# Altium footprint library MyComponents_v2.5.PcbLib: 403 footprints (part 19 of 26)
Each footprint in its own frame and in the unit in brackets; x right, y up, seen from the top. Pads: shape width x height; smd on the part's side, far side on the other; paste and mask are expansions set on the pad; w line width, h text height; cw(c..) or ccw(c..) is an arc to the next point about the centre after c.
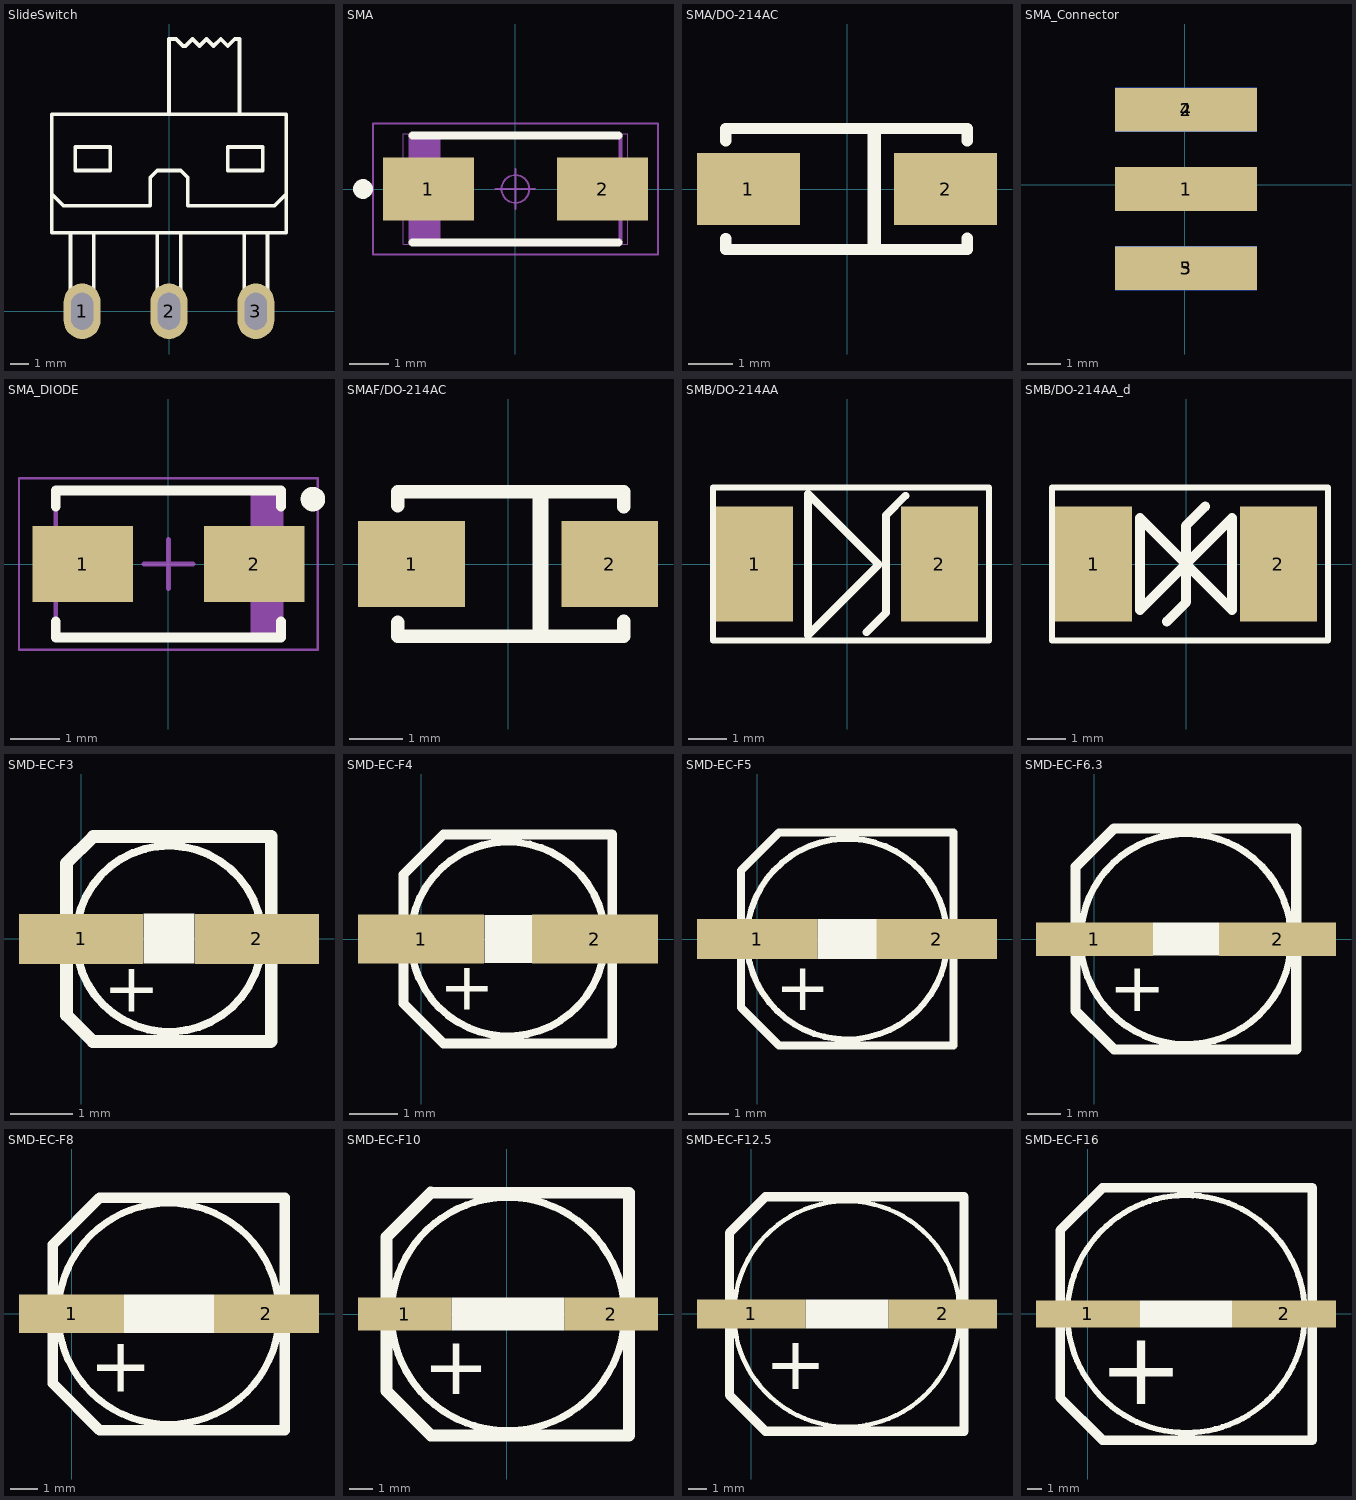
[diagram p18: the footprints below, top view; thin cyan lines are the x and y axes]

## SlideSwitch [mm]
pads (3):
  oval 2x3 hole 1.2 slot 2 at 90 deg: 1(-4.7,0) 2(0,0) 3(4.7,0)
Top Overlay:
  lines w0.2: -6.35,6.35 -5.715,5.715 -1.016,5.715 -1.016,7.239 -0.635,7.62 ; -5.334,4.242 -5.334,-0.127 ccw(c-4.699,0.508) -4.064,-0.127 -4.064,4.242 ; -0.635,4.242 -0.635,-0.127 ccw(c0,0.508) 0.635,-0.127 0.635,4.242 ; -0.127,10.668 3.81,10.668 3.81,14.732 3.556,14.732 3.175,14.351 2.794,14.732 2.413,14.351 2.032,14.732 1.651,14.351 1.27,14.732 0.889,14.351 0.762,14.351 0.381,14.732 0,14.732 0,10.668 ; 4.064,4.242 4.064,-0.127 ccw(c4.699,0.508) 5.334,-0.127 5.334,4.242 ; 6.35,6.35 5.715,5.715 1.016,5.715 1.016,7.239 0.635,7.62 ; -0.635,7.62 0.635,7.62 ; -0.635,7.62 0.635,7.62 ; -6.35,4.242 -6.35,10.668 6.35,10.668 6.35,4.242 -6.35,4.242 ; -5.08,7.62 -5.08,8.89 -3.175,8.89 -3.175,7.62 -5.08,7.62 ; 3.175,7.62 5.08,7.62 5.08,8.89 3.175,8.89 3.175,7.62
3D body "Slide Switch.step": height 6.6, standoff -3.17, extent -6.833,-0.62 6.578,15.621

## SMA [mm]
pads (2):
  rect 2.3x1.6 smd: 1(-2.2,0) 2(2.2,0)
Top Overlay:
  circle w0.25: c-3.85,0 r0.125
  lines w0.2: -2.6,-1.35 2.6,-1.35 ; -2.6,1.35 2.6,1.35
Mechanical 15:
  lines w0.1: -2.548,-1.335 -2.548,1.335 ; -2.448,-1.335 -2.448,1.335 ; -2.348,-1.335 -2.348,1.335 ; -2.248,-1.335 -2.248,1.335 ; -2.148,-1.335 -2.148,1.335 ; -2.047,-1.335 -2.047,1.335 ; -1.948,-1.335 -1.948,1.335 ; -2.648,-1.335 -2.648,1.335 2.648,1.335 2.648,-1.335 -2.648,-1.335
Mechanical 16:
  circle w0.05: c0,0 r0.35
  lines w0.001: -2.83,-1.4 -2.83,1.4 2.83,1.4 2.83,-1.4 -2.83,-1.4
  lines w0.05: -0.5,0 0.5,0 ; 0,-0.5 0,0.5 ; -3.6,-1.65 -3.6,1.65 3.6,1.65 3.6,-1.65 -3.6,-1.65

## SMA/DO-214AC [mm] "SS14/M7"
height 2.7
pads (2):
  rect 2.3x1.6 smd: 1(-2.2,0) 2(2.2,0)
Top Overlay:
  lines w0.254: -2.711,-1.105 -2.711,-1.35 2.689,-1.35 2.689,-1.1 ; -2.711,1.08 -2.711,1.35 2.684,1.35 ; 2.689,1.075 2.689,1.35
  lines w0.3: 0.609,-1.3 0.609,1.3
3D body "User Library-S1G.STEP": height 2.12, standoff -0.02, extent -2.509,-1.342 2.596,1.325

## SMA_Connector [mm]
pads (5):
  rect 4.2x1.3 smd: 1(0.037,-0.125) 2(0.037,2.225) 3(0.037,-2.475)
  rect 4.2x1.3 smd far side: 4(0.037,2.225) 5(0.037,-2.475)

## SMA_DIODE [mm] "Molded Diode, 2-Leads, Body 4.30x2.60mm, IPC Medium Density"
height 2.2
pads (2):
  rect 2.05x1.55 smd: 1(-1.75,0) 2(1.75,0)
Top Overlay:
  circle w0.25: c2.95,1.325 r0.125
  lines w0.2: -2.3,-1.175 -2.3,-1.5 2.3,-1.5 2.3,-1.175 ; -2.3,1.175 -2.3,1.5 2.3,1.5 2.3,1.175
Mechanical 13:
  rectangle: 1.681,-1.46 2.3,1.46
  lines w0.1: -2.3,-1.46 -2.3,1.46 2.3,1.46 2.3,-1.46 -2.3,-1.46
Mechanical 15:
  lines w0.05: -3.05,-1.75 -3.05,1.75 3.05,1.75 3.05,-1.75 -3.05,-1.75
  lines w0.1: -0.5,0 0.5,0 ; 0,-0.5 0,0.5
3D body: height 2.2, standoff 0, extent -2.3,-1.46 2.3,1.46

## SMAF/DO-214AC [mm] "SS14/M7"
height 2.7
pads (2):
  rect 2x1.6 smd: 1(-1.8,0)
  rect 1.8x1.6 smd: 2(1.9,0)
Top Overlay:
  lines w0.254: -2.057,-1.092 -2.057,-1.35 2.159,-1.35 2.159,-1.067 ; -2.057,1.092 -2.057,1.35 2.159,1.35 2.159,1.067
  lines w0.3: 0.609,-1.3 0.609,0 0.609,1.3
3D body "SMAF-DO-214AD.step": height 1, standoff 0, extent -2.307,-1.255 2.393,1.245

## SMB/DO-214AA [mm]
pads (2):
  rect 2x3 smd: 1(-2.413,0) 2(2.413,0)
Top Overlay:
  lines w0.152: 3.7,-2 -3.5,-2 -3.5,2 3.7,2 3.7,-2 ; 3.7,-2 3.7,-2
  lines w0.203: 0.508,-1.778 1.016,-1.27 1.016,1.27 1.524,1.778 ; -1.016,-1.854 -1.016,1.829 0.826,-0.013 -1.016,-1.854
3D body "SMBJ33CAHE3.step": height 2.44, standoff -0.01, extent -2.684,-2.135 2.906,1.805

## SMB/DO-214AA_d [mm] "双向"
pads (2):
  rect 2x3 smd: 1(-2.413,0) 2(2.413,0)
Top Overlay:
  lines w0.152: 3.7,-2 3.7,2 -3.5,2 -3.5,-2 3.7,-2 ; 3.7,-2 3.7,-2
  lines w0.254: -0.5,-1.5 0,-1 0,1 0.5,1.5 ; 0,0 -1.2,1.2 -1.2,-1.2 0,0 ; 0,0 1.2,1.2 1.2,-1.2 0,0
3D body "SMBJ33CAHE3.step": height 2.44, standoff -0.01, extent -2.684,-2.135 2.906,1.805

## SMD-EC-F3 [mm] "铝电解电容"
pads (2):
  rect 2x0.8 smd: 1(0,0) 2(2.835,0)
Top Overlay:
  rectangle: 1.003,-0.399 1.832,0.407
  lines w0.127: 2.777,0.636 ccw(c1.417,0.003) 2.777,0.634
  lines w0.203: 0.19,1.646 -0.234,1.222 -0.234,-1.229 0.19,-1.653 3.059,-1.653 ; 0.195,1.651 3.066,1.651 3.066,-1.647
  text "+" at 0.361,-1.174 h0.8

## SMD-EC-F4 [mm] "铝电解电容"
pads (2):
  rect 2.6x1 smd: 1(0,0) 2(3.579,0)
Top Overlay:
  rectangle: 1.302,-0.499 2.279,0.5
  lines w0.152: 3.561,0.924 ccw(c1.787,0) 3.562,0.921
  lines w0.203: 3.936,2.151 0.461,2.151 -0.364,1.325 -0.364,-1.324 0.461,-2.15 3.937,-2.15 3.937,2.15
  text "+" at 0.37,-1.46 h1

## SMD-EC-F5 [mm] "铝电解电容"
pads (2):
  rect 3x1 smd: 1(0,0) 2(4.477,0)
Top Overlay:
  rectangle: 1.5,-0.5 2.981,0.5
  lines w0.152: 4.412,1.239 ccw(c2.241,0) 4.415,1.235
  lines w0.203: 0.217,-2.33 -0.407,-1.706 ; 4.89,2.656 0.542,2.656 0.541,2.655 -0.407,1.707 -0.407,-1.706 ; 4.891,-2.654 0.542,-2.654 0.542,-2.654 -0.407,-1.706 ; 4.892,-2.654 4.892,2.654
  text "+" at 0.445,-1.777 h1.2

## SMD-EC-F6.3 [mm] "铝电解电容"
pads (2):
  rect 3.5x1 smd: 1(0,0) 2(5.475,0)
Top Overlay:
  rectangle: 1.746,-0.496 3.73,0.5
  lines w0.203: 5.667,1.156 ccw(c2.736,0.002) 5.667,1.154
  lines w0.305: 0.587,-3.303 -0.564,-2.152 -0.564,2.163 0.587,3.314 ; 0.589,-3.305 6.036,-3.305 6.036,3.309 0.592,3.309
  text "+" at 0.43,-2.164 h1.5
3D body "SMD SVP 6_3x5_9.STEP": height 5.9, standoff 0, extent -0.95,-3.3 6.35,3.3

## SMD-EC-F8 [mm] "铝电解电容"
pads (2):
  rect 3.8x1.4 smd: 1(0,0) 2(7.051,0)
Top Overlay:
  rectangle: 1.89,-0.7 5.153,0.7
  lines w0.254: 7.515,0 ccw(c3.515,0) 7.515,0
  lines w0.381: -0.686,2.499 1.013,4.198 ; -0.686,2.499 -0.686,-2.52 1.013,-4.219 7.714,-4.219 7.714,4.198 1.013,4.198 ; -0.686,2.499 1.013,4.198
  text "+" at 0.64,-2.818 h2
3D body "User Library-ALU-F.STEP": height 10.2, standoff 0, extent -1.394,-4.15 8.506,4.15

## SMD-EC-F10 [mm] "铝电解电容"
pads (2):
  rect 4x1.4 smd: 1(-4.38,0) 2(4.48,0)
Top Overlay:
  circle w0.305: c0.042,0 r5
  rectangle: -2.374,-0.701 2.469,0.707
  lines w0.508: -3.26,5.203 -5.158,3.306 -5.158,-3.304 -3.26,-5.201 5.24,-5.201 5.24,5.2 -3.257,5.2
  text "+" at -3.6,-3.44 h2.5
3D body "CAP SMD SVP 10_0x12_6.STEP": height 12.6, standoff 0, extent -5.5,-5.15 5.5,5.15

## SMD-EC-F12.5 [mm] "铝电解电容"
pads (2):
  rect 6x1.6 smd: 1(0,0) 2(10.625,0)
Top Overlay:
  circle w0.254: c5.303,0 r6.25
  rectangle: 3.019,-0.8 7.601,0.8
  lines w0.508: -1.202,-4.498 0.799,-6.499 11.797,-6.499 11.797,6.495 0.799,6.495 0.797,6.493 -1.202,4.494 -1.202,-4.498
  text "+" at 0.75,-4.168 h3

## SMD-EC-F16 [mm] "铝电解电容"
pads (2):
  rect 7x1.8 smd: 1(0,0) 2(13.215,0)
Top Overlay:
  rectangle: 3.503,-0.9 9.696,0.914
  lines w0.381: 14.301,2.24 ccw(c6.62,0.001) 14.315,2.19
  lines w0.635: 15.122,-8.499 15.123,-8.5 ; 15.122,8.496 15.123,8.497 ; 15.123,-8.5 15.123,8.497 ; 15.123,-8.5 0.981,-8.5 -1.877,-5.642 -1.877,5.638 0.981,8.497 15.123,8.497
  text "+" at 0.729,-6.087 h5